# Altium footprint library surface.PcbLib: 97 footprints (part 2 of 7)
Each footprint in its own frame and in the unit in brackets; x right, y up, seen from the top. Pads: shape width x height; smd on the part's side, far side on the other; paste and mask are expansions set on the pad; w line width, h text height; cw(c..) or ccw(c..) is an arc to the next point about the centre after c.
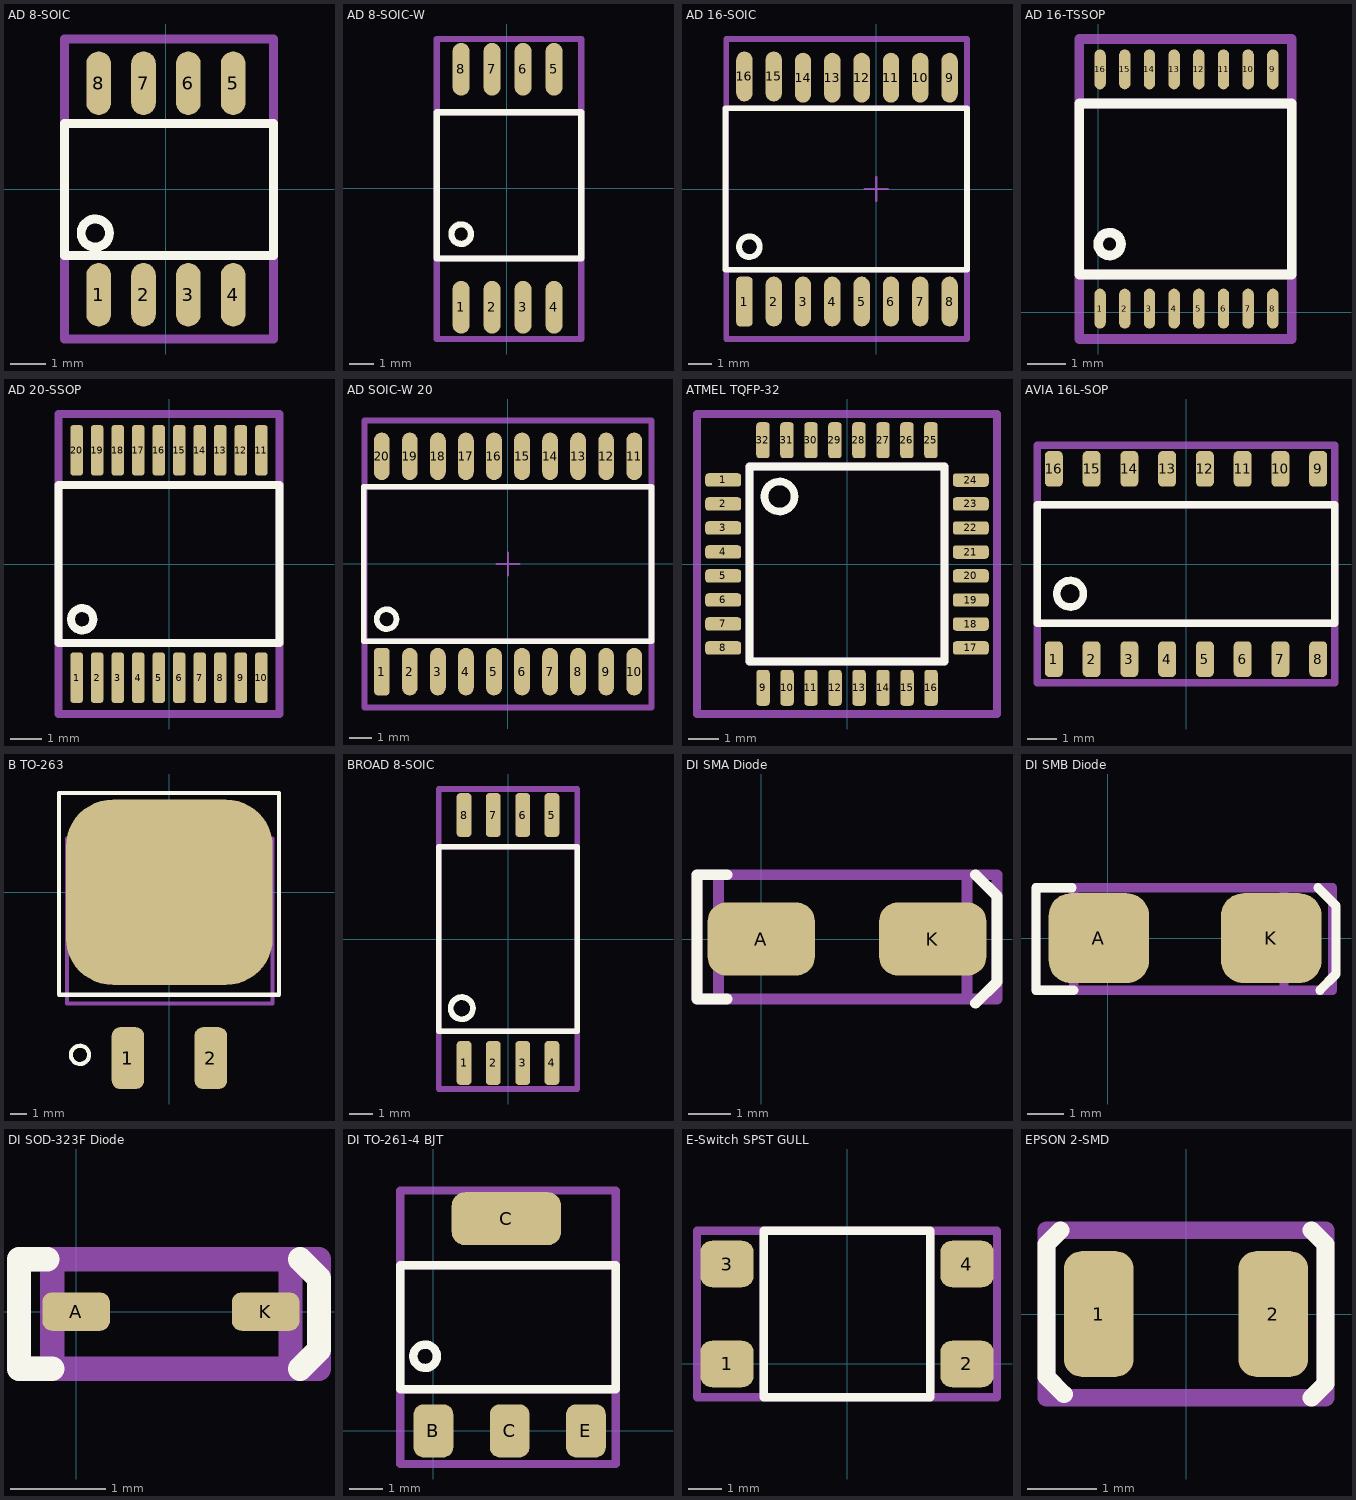
[diagram p1: the footprints below, top view; thin cyan lines are the x and y axes]

## AD 8-SOIC [mm]
pads (8):
  oval 0.7x1.8 smd: 1(-1.905,-3) 2(-0.635,-3) 3(0.635,-3) 4(1.905,-3) 5(1.905,3) 6(0.635,3) 7(-0.635,3) 8(-1.905,3)
Top Overlay:
  circle w0.254: c-2,-1.25 r0.4
  lines w0.254: -2.873,-1.88 3.048,-1.88 3.048,1.854 -2.873,1.854 -2.873,-1.88
Mechanical 13:
  lines w0.254: -2.873,-1.88 -2.873,1.854 3.048,1.854 3.048,-1.88 -2.873,-1.88
Mechanical 15:
  lines w0.254: -2.873,-4.25 -2.873,4.25 3.048,4.25 3.048,-4.25 -2.873,-4.25
3D body "R_8-L.step": height 1.76, standoff 0, extent -2.502,-3.099 2.502,3.099

## AD 8-SOIC-W [mm]
pads (8):
  oval 0.7x2.159 smd: 1(-1.873,-4.887) 2(-0.603,-4.887) 3(0.667,-4.887) 4(1.937,-4.887) 5(1.937,4.873) 6(0.667,4.873) 7(-0.603,4.873) 8(-1.873,4.873)
Top Overlay:
  circle w0.254: c-1.873,-1.887 r0.4
  lines w0.254: -2.873,-2.887 -2.873,3.113 3.048,3.113 3.048,-2.887 -2.873,-2.887
Mechanical 13:
  lines w0.254: -2.873,-2.887 3.048,-2.887 3.048,3.113 -2.873,3.113 -2.873,-2.887
Mechanical 15:
  lines w0.254: -2.873,-6.187 3.048,-6.187 3.048,6.113 -2.873,6.113 -2.873,-6.187
3D body "ACPL-C87AT-500E--3DModel-STEP-56544.STEP": height 3.68, standoff 0.08, extent -2.921,-5.753 2.921,5.753

## AD 16-SOIC [mil]
pads (16):
  rrect50% 28x85 smd: 1(-225,-192.02)
  oval 28x85 smd: 2(-175,-192.02) 3(-125,-192.02) 4(-75,-192.02) 5(-25,-192.02) 6(25,-192.02) 7(75,-192.02) 8(125,-192.02) 9(125,190) 10(75,189.96) 11(25,189.96) 12(-25,189.96) 13(-75,189.96) 14(-125,189.96) 15(-175,191.98) 16(-225,191.98)
Top Overlay:
  circle w10: c-216.54,-98.43 r17.61
  lines w10: -257,-137.8 155,-137.8 155,137.8 -257,137.8 -257,-137.8
Mechanical 13:
  lines w10: -255.91,-137.8 -255.91,137.8 155,137.8 155,-137.8 -255.91,-137.8
Mechanical 15:
  lines w3.94: -20,0 0,0 ; 0,-20 0,0 ; 0,20 0,0 ; 20,0 0,0
  lines w10: -255.91,-255.91 155,-255.91 155,255.91 -255.91,255.91 -255.91,-255.91
3D body "RW_16.step": height 104.09, standoff 0, extent -256.5,-209.48 156.5,209.49

## AD 16-TSSOP [mm]
pads (16):
  oval 0.3x1.05 smd: 1(0.05,0.1) 2(0.7,0.1) 3(1.35,0.1) 4(2,0.1) 5(2.65,0.1) 6(3.3,0.1) 7(3.95,0.1) 8(4.6,0.1) 9(4.6,6.4) 10(3.95,6.4) 11(3.3,6.4) 12(2.65,6.4) 13(2,6.4) 14(1.35,6.4) 15(0.7,6.4) 16(0.05,6.4)
Top Overlay:
  circle w0.254: c0.3,1.8 r0.3
  lines w0.254: -0.5,1 -0.5,5.5 5.1,5.5 5.1,1 -0.5,1
Mechanical 13:
  lines w0.254: -0.5,1 -0.5,5.5 5.1,5.5 5.1,1 -0.5,1
Mechanical 15:
  lines w0.254: -0.5,-0.7 5.1,-0.7 5.1,7.2 -0.5,7.2 -0.5,-0.7
3D body "AD 16-TSSOP.step": height 1.2, standoff 0, extent -0.244,0.05 4.862,6.45

## AD 20-SSOP [mm]
pads (20):
  rrect50% 0.4x1.6 smd: 1(-2.925,-3.6) 2(-2.275,-3.6) 3(-1.625,-3.6) 4(-0.975,-3.6) 5(-0.325,-3.6) 6(0.325,-3.6) 7(0.975,-3.6) 8(1.625,-3.6) 9(2.275,-3.6) 10(2.925,-3.6) 11(2.925,3.6) 12(2.275,3.6) 13(1.625,3.6) 14(0.975,3.6) 15(0.325,3.6) 16(-0.325,3.6) 17(-0.975,3.6) 18(-1.625,3.6) 19(-2.275,3.6) 20(-2.925,3.6)
Top Overlay:
  circle w0.254: c-2.75,-1.75 r0.354
  lines w0.254: -3.5,-2.5 -3.5,2.5 3.5,2.5 3.5,-2.5 -3.5,-2.5
Mechanical 13:
  lines w0.254: -3.5,-2.5 3.5,-2.5 3.5,2.5 -3.5,2.5 -3.5,-2.5
Mechanical 15:
  lines w0.254: -3.5,-4.75 -3.5,4.75 3.5,4.75 3.5,-4.75 -3.5,-4.75
3D body "SSOP-20-5_3.step": height 1.2, standoff 0, extent -3.64,-3.9 3.56,3.9

## AD SOIC-W 20 [mil]
height 68.9
pads (20):
  rrect50% 28x85 smd: 1(-225,-192.02)
  oval 28x85 smd: 2(-175,-192.02) 3(-125,-192.02) 4(-75,-192.02) 5(-25,-192.02) 6(25,-192.02) 7(75,-192.02) 8(125,-192.02) 9(175,-192.02) 10(225,-192.02) 11(225,192.02) 12(175,191.98) 13(125,191.98) 14(75,191.98) 15(25,191.98) 16(-25,191.98) 17(-75,191.98) 18(-125,191.98) 19(-175,191.98) 20(-225,191.98)
Top Overlay:
  circle w10: c-216.54,-98.43 r17.61
  lines w10: -257,-137.8 256,-137.8 256,137.8 -257,137.8 -257,-137.8
Mechanical 13:
  lines w10: -255.91,-137.8 255.91,-137.8 255.91,137.8 -255.91,137.8 -255.91,-137.8
Mechanical 15:
  lines w3.94: -20,0 0,0 ; 0,-20 0,0 ; 0,20 0,0 ; 20,0 0,0
  lines w10: -255.91,-255.91 255.91,-255.91 255.91,255.91 -255.91,255.91 -255.91,-255.91
3D body "SO20W-Body.STEP": height 104.72, standoff 10.63, extent -259.83,-157.27 259.85,157.27
3D body "SOW-Leg.STEP": height 72.99, standoff 0, extent 214.76,-210.02 235.24,-148.6
3D body "SOW-Leg.STEP": height 72.99, standoff 0, extent -235.24,148.56 -214.76,209.98
3D body "SOW-Leg.STEP": height 72.99, standoff 0, extent -185.24,148.56 -164.76,209.98
3D body "SOW-Leg.STEP": height 72.99, standoff 0, extent -135.24,148.56 -114.76,209.98
3D body "SOW-Leg.STEP": height 72.99, standoff 0, extent -85.24,148.56 -64.76,209.98
3D body "SOW-Leg.STEP": height 72.99, standoff 0, extent -35.24,148.56 -14.76,209.98
3D body "SOW-Leg.STEP": height 72.99, standoff 0, extent 14.76,148.56 35.24,209.98
3D body "SOW-Leg.STEP": height 72.99, standoff 0, extent 64.76,148.56 85.24,209.98
3D body "SOW-Leg.STEP": height 72.99, standoff 0, extent 114.76,148.56 135.24,209.98
3D body "SOW-Leg.STEP": height 72.99, standoff 0, extent -235.24,-210.02 -214.76,-148.6
3D body "SOW-Leg.STEP": height 72.99, standoff 0, extent -185.24,-210.02 -164.76,-148.6
3D body "SOW-Leg.STEP": height 72.99, standoff 0, extent -135.24,-210.02 -114.76,-148.6
3D body "SOW-Leg.STEP": height 72.99, standoff 0, extent -85.24,-210.02 -64.76,-148.6
3D body "SOW-Leg.STEP": height 72.99, standoff 0, extent -35.24,-210.02 -14.76,-148.6
3D body "SOW-Leg.STEP": height 72.99, standoff 0, extent 14.76,-210.02 35.24,-148.6
3D body "SOW-Leg.STEP": height 72.99, standoff 0, extent 64.76,-210.02 85.24,-148.6
3D body "SOW-Leg.STEP": height 72.99, standoff 0, extent 114.76,-210.02 135.24,-148.6
3D body "SOW-Leg.STEP": height 72.99, standoff 0, extent 164.76,-210.02 185.24,-148.6
3D body "SOW-Leg.STEP": height 72.99, standoff 0, extent 164.76,148.6 185.24,210.02
3D body "SOW-Leg.STEP": height 72.99, standoff 0, extent 214.76,148.6 235.24,210.02

## ATMEL TQFP-32 [mm]
pads (32):
  rrect50% 1.2x0.45 smd: 1(-4.125,2.8) 2(-4.125,2) 3(-4.125,1.2) 4(-4.125,0.4) 5(-4.125,-0.4) 6(-4.125,-1.2) 7(-4.125,-2) 8(-4.125,-2.8) 17(4.125,-2.8) 18(4.125,-2) 19(4.125,-1.2) 20(4.125,-0.4) 21(4.125,0.4) 22(4.125,1.2) 23(4.125,2) 24(4.125,2.8)
  rrect50% 0.45x1.2 smd: 9(-2.8,-4.125) 10(-2,-4.125) 11(-1.2,-4.125) 12(-0.4,-4.125) 13(0.4,-4.125) 14(1.2,-4.125) 15(2,-4.125) 16(2.8,-4.125) 25(2.8,4.125) 26(2,4.125) 27(1.2,4.125) 28(0.4,4.125) 29(-0.4,4.125) 30(-1.2,4.125) 31(-2,4.125) 32(-2.8,4.125)
Top Overlay:
  circle w0.254: c-2.25,2.25 r0.5
  lines w0.254: -3.25,-3.25 3.25,-3.25 3.25,3.25 -3.25,3.25 -3.25,-3.25
Mechanical 13:
  lines w0.254: -3.25,-3.25 -3.25,3.25 3.25,3.25 3.25,-3.25 -3.25,-3.25
Mechanical 15:
  lines w0.254: -5,-5 -5,5 5,5 5,-5 -5,-5
3D body "TQFP-32.STEP": height 1.1, standoff 0, extent -4.5,-4.5 4.5,4.5

## AVIA 16L-SOP [mm]
pads (16):
  rrect50% 0.6x1.2 smd: 1(-4.445,-3.2) 2(-3.175,-3.2) 3(-1.905,-3.2) 4(-0.635,-3.2) 5(0.635,-3.2) 6(1.905,-3.2) 7(3.175,-3.2) 8(4.445,-3.2) 9(4.445,3.2) 10(3.175,3.2) 11(1.905,3.2) 12(0.635,3.2) 13(-0.635,3.2) 14(-1.905,3.2) 15(-3.175,3.2) 16(-4.445,3.2)
Top Overlay:
  circle w0.254: c-3.9,-1 r0.447
  lines w0.254: -5,-2 5,-2 5,2 -5,2 -5,-2
Mechanical 13:
  lines w0.254: -5,-2 5,-2 5,2 -5,2 -5,-2
Mechanical 15:
  lines w0.254: -5,-4 5,-4 5,4 -5,4 -5,-4
3D body "HX711_SOP16.stp": height 1.52, standoff -0.04, extent -4.98,-3.341 5.02,3.359

## B TO-263 [mm]
pads (3):
  rrect50% 2x3.8 smd: 1(-2.55,-10.2) 2(2.55,-10.2)
  rrect50% 12.7x11.4 smd: ""(0,0)
Top Overlay:
  circle w0.254: c-5.5,-10 r0.559
  lines w0.254: -6.8,-6.3 6.75,-6.3 6.75,6.1 -6.8,6.1 -6.8,-6.3
Mechanical 13:
  lines w0.254: -6.3,-6.85 -0.4,-6.85 6.35,-6.85 6.35,3.3 -6.3,3.3 -6.3,-6.85
Mechanical 15:
  lines w0.254: -6.3,-6.85 -6.3,3.3 6.35,3.3 6.35,-6.85 -6.3,-6.85
3D body "TO-263AB.stp": height 4.8, standoff 0, extent -5.193,-11.025 5.45,4.825

## BROAD 8-SOIC [mm]
pads (8):
  rrect50% 0.64x1.905 smd: 1(-1.905,-5.372) 2(-0.635,-5.372) 3(0.635,-5.372) 4(1.905,-5.372) 5(1.905,5.372) 6(0.635,5.372) 7(-0.635,5.372) 8(-1.905,5.372)
Top Overlay:
  circle w0.254: c-2,-3 r0.48
  lines w0.254: -3,-4 -3,4 3,4 3,-4 -3,-4
Mechanical 13:
  lines w0.254: -3,-4 -3,-3.135 -3,4 3,4 3,-4 -1.425,-4 -3,-4
Mechanical 15:
  lines w0.254: -3,-6.5 -3,6.5 3,6.5 3,-6.5 -3,-6.5
3D body "ACPL-C87AT-500E--3DModel-STEP-56544.STEP": height 3.68, standoff 0.08, extent -2.921,-5.753 2.921,5.753

## DI SMA Diode [mm]
pads (2):
  rrect50% 2.5x1.7 smd: A(0,0) K(4,0)
Top Overlay:
  lines w0.254: -0.8,-1.4 -1.5,-1.4 -1.5,1.5 -0.8,1.5 ; 5,-1.5 5.5,-1 5.5,1 5,1.5
Mechanical 13:
  lines w0.254: -1,-1.4 4.8,-1.4 4.8,1.5 -1,1.5 -1,-1.4
Mechanical 15:
  lines w0.254: -1.5,-1.4 -1.5,1.5 5.5,1.5 5.5,-1.4 -1.5,-1.4
3D body "SMA.step": height 2.35, standoff 0, extent -0.795,-1.46 4.795,1.46

## DI SMB Diode [mm]
pads (2):
  rrect50% 2.8x2.5 smd: A(-0.25,0) K(4.55,0)
Top Overlay:
  lines w0.254: -1,1.4 -2,1.4 -2,-1.45 -0.95,-1.45 ; 5.85,1.4 6.35,0.9 6.35,-1 5.9,-1.45
Mechanical 13:
  lines w0.254: -0.95,-1.45 -0.95,1.4 ; -0.7,-1.45 4.9,-1.45 4.9,1.4 -0.7,1.4
Mechanical 15:
  lines w0.254: -2,-1.45 6.25,-1.45 6.25,1.4 -0.55,1.4 -2,1.4 -2,-1.45
3D body "SMA.step": height 2.35, standoff 0, extent -0.695,-1.45 4.895,1.47

## DI SOD-323F Diode [mm]
pads (2):
  rrect50% 0.71x0.403 smd: A(0,0) K(1.99,0)
Top Overlay:
  lines w0.254: -0.3,0.55 -0.6,0.55 -0.6,-0.6 -0.25,-0.6 ; 2.35,-0.6 2.55,-0.4 2.55,0.35 2.35,0.55
Mechanical 13:
  lines w0.254: -0.25,-0.6 -0.25,0.55 2.25,0.55 2.25,-0.6 -0.25,-0.6
Mechanical 15:
  lines w0.254: -0.6,-0.6 -0.25,-0.6 2.55,-0.6 2.55,0.55 -0.25,0.55 -0.6,0.55 -0.6,-0.6
3D body "BAS21J_115.step": height 0.8, standoff 0, extent -0.25,-0.675 2.25,0.675

## DI TO-261-4 BJT [mm]
pads (4):
  rrect50% 1.2x1.6 smd: B(0,0) C(2.3,0) E(4.6,0)
  rrect50% 3.3x1.6 smd: C(2.2,6.4)
Top Overlay:
  circle w0.254: c-0.25,2.25 r0.354
  lines w0.254: -1,1.25 -1,5 5.5,5 5.5,1.25 -1,1.25
Mechanical 13:
  lines w0.254: -1,1.25 5.5,1.25 5.5,5 -1,5 -1,1.25
Mechanical 15:
  lines w0.254: -1,-1 -1,7.25 5.5,7.25 5.5,-1 -1,-1
3D body "SOT223-3.step": height 1.6, standoff 0, extent -1,-0.5 5.5,6.574

## E-Switch SPST GULL [mm]
pads (4):
  rrect50% 1.6x1.4 smd: 1(-3.6,0) 2(3.6,0) 3(-3.6,3) 4(3.6,3)
Top Overlay:
  lines w0.254: -2.5,-1 -2.5,4 2.5,4 2.5,-1 -2.5,-1
Mechanical 13:
  lines w0.254: -2.5,-1 -2.5,4 2.5,4 2.5,-1 -2.5,-1
Mechanical 15:
  lines w0.254: -4.5,-1 -4.5,4 4.5,4 4.5,-1 -4.5,-1
3D body "TL3305AFxxxxG.stp": height 3.7, standoff -0.1, extent -3.65,-0.75 3.85,3.75

## EPSON 2-SMD [mm]
pads (2):
  rrect50% 1x1.8 smd: 1(-1.25,0) 2(1.25,0)
Top Overlay:
  lines w0.254: -1.8,1.2 -2,1 ; -1.75,-1.15 -2,-0.9 ; 1.8,-1.2 2,-1 2,1 ; 1.8,1.2 2,1 ; -2,-0.9 -2,1 ; -2,-0.9 -2,-0.9 ; -2,1 -2,1 ; 2,1 2,1 ; 2,1 2,1
Mechanical 13:
  lines w0.254: -2,-1.2 2,-1.2 2,1.2 -2,1.2 -2,-1.2
Mechanical 15:
  lines w0.254: -2,-1.2 2,-1.2 2,1.2 -2,1.2 -2,-1.2
3D body: height 1, standoff 0, extent -1.5,-1 1.5,1